# Altium footprint library 元件2.PcbLib: 204 footprints (part 13 of 13)
Each footprint in its own frame and in the unit in brackets; x right, y up, seen from the top. Pads: shape width x height; smd on the part's side, far side on the other; paste and mask are expansions set on the pad; w line width, h text height; cw(c..) or ccw(c..) is an arc to the next point about the centre after c.
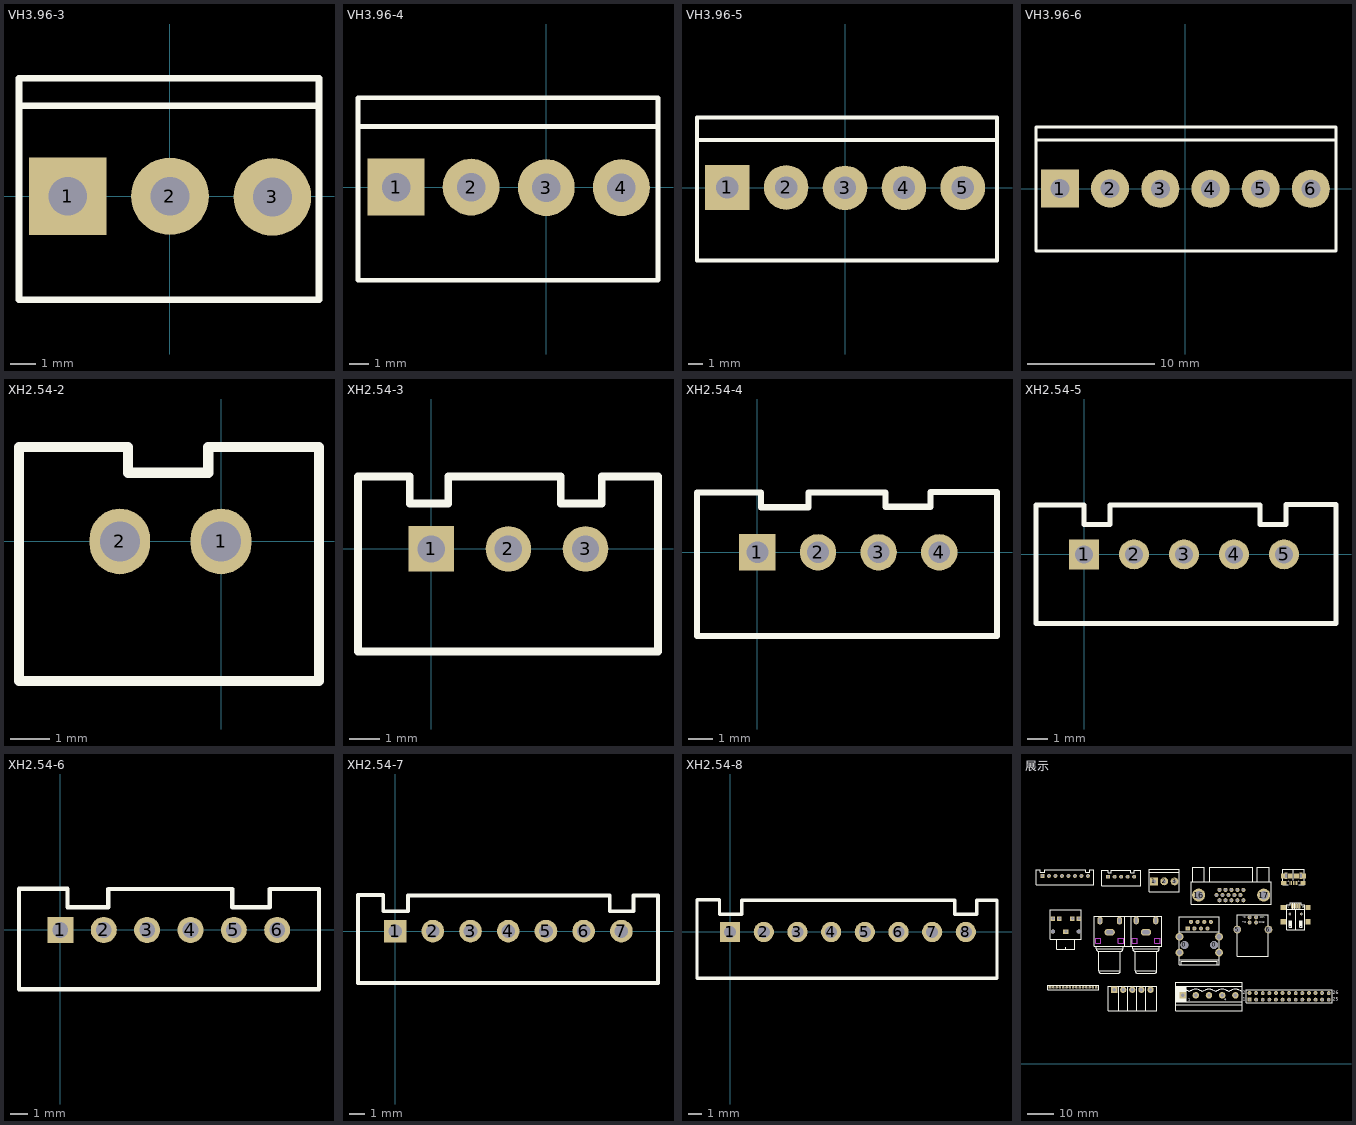
[diagram p12: the footprints below, top view; thin cyan lines are the x and y axes]

## VH3.96-3 [mm]
height 3.5
pads (3):
  rect 3x3 hole 1.5 square: 1(-3.96,0)
  round 3 hole 1.5 square: 2(0,0) 3(3.962,-0.025)
Top Overlay:
  lines w0.254: -5.842,3.505 5.74,3.505 ; -5.842,-4.013 5.766,-4.013 5.766,4.572 -5.842,4.572 -5.842,-4.013
3D body "VH3.stp": height 14.83, standoff -3.46, extent -5.842,-5.15 5.893,4.858

## VH3.96-4 [mm]
height 3.5
pads (4):
  rect 3x3 hole 1.5 square: 1(-7.921,0.013)
  round 3 hole 1.5 square: 2(-3.961,0.013) 3(0.001,-0.013) 4(3.961,-0.013)
Top Overlay:
  lines w0.254: -9.86,3.213 5.893,3.213 ; -9.931,-4.902 -9.931,4.724 5.893,4.724 5.893,-4.902 -9.931,-4.902
3D body "VH4.stp": height 14.83, standoff -3.46, extent -9.83,-5.055 5.867,4.953

## VH3.96-5 [mm]
height 3.5
pads (5):
  rect 3x3 hole 1.5 square: 1(-7.921,0.013)
  round 3 hole 1.5 square: 2(-3.961,0.013) 3(0.001,-0.013) 4(3.961,-0.013) 5(7.921,-0.013)
Top Overlay:
  lines w0.254: -9.86,3.213 10.147,3.213 ; -9.957,-4.902 -9.957,4.724 10.223,4.724 10.223,-4.902 -9.957,-4.902
3D body "VH5.stp": height 14.83, standoff -3.46, extent -9.728,-5.048 9.932,4.959

## VH3.96-6 [mm]
height 3.5
pads (6):
  rect 3x3 hole 1.5 square: 1(-9.901,0.013)
  round 3 hole 1.5 square: 2(-5.941,0.013) 3(-1.979,-0.013) 4(1.981,-0.013) 5(5.941,-0.013) 6(9.901,-0.013)
Top Overlay:
  lines w0.254: -11.789,3.848 11.839,3.848 ; -11.789,-4.928 -11.789,4.877 11.89,4.877 11.89,-4.928 -11.789,-4.928
3D body "VH6.stp": height 14.43, standoff -3.86, extent -11.709,-5.08 11.913,4.928

## XH2.54-2 [mil]
pads (2):
  oval 60x65 hole 39.37: 1(0,0) 2(-100.1,0)
Top Overlay:
  lines w10: -200,-138 97,-138 97,93.3 66.2,93.3 -12.6,93.3 -12.6,68 -92.1,68 -92.1,93.3 -200,93.3 -200,-138
3D body "sip2_n.stp": height 275.59, standoff -118.11, extent -197.64,-142.11 97.64,94.11

## XH2.54-3 [mm]
pads (3):
  rect 1.5x1.5 hole 0.9: 1(0,0)
  round 1.5 hole 0.9: 2(2.54,0) 3(5.08,0)
Top Overlay:
  lines w0.254: -2.413,-3.378 -2.413,2.388 -0.711,2.388 -0.711,1.5 0.559,1.5 0.559,2.388 4.267,2.388 4.267,1.5 5.613,1.5 5.613,2.388 7.468,2.388 7.468,-3.378 -2.413,-3.378
3D body "3pin-2.5.step": height 7, standoff -3.4, extent -2.41,-3.408 7.49,2.342

## XH2.54-4 [mm]
pads (4):
  rect 1.5x1.5 hole 0.9: 1(0,0)
  round 1.5 hole 0.9: 2(2.5,0) 3(5,0) 4(7.5,0)
Top Overlay:
  lines w0.254: -2.489,-3.454 -2.489,2.464 0.152,2.464 0.152,1.854 2.108,1.854 2.108,2.464 5.283,2.464 5.283,1.88 7.137,1.88 7.137,2.489 9.881,2.489 9.881,-3.454 -2.489,-3.454
3D body "4pin-2.5.step": height 7, standoff -3.4, extent -2.466,-3.383 9.934,2.367

## XH2.54-5 [mm]
pads (5):
  rect 1.5x1.5 hole 0.9: 1(0,0)
  round 1.5 hole 0.9: 2(2.5,0) 3(5,0) 4(7.5,0) 5(10,0)
Top Overlay:
  lines w0.254: 1.3,2.438 1.3,1.5 0,1.5 0,2.464 -2.4,2.464 -2.4,-3.454 12.6,-3.454 12.6,2.489 10.1,2.489 10.1,1.5 8.8,1.5 8.8,2.464 1.3,2.464
3D body "User Library-jst-b5b-xh-a.STEP": height 7, standoff -3.4, extent -2.511,-3.388 12.519,2.362

## XH2.54-6 [mm]
pads (6):
  rect 1.5x1.5 hole 0.9: 1(0,0)
  round 1.5 hole 0.9: 2(2.5,0) 3(5,0) 4(7.5,0) 5(10,0) 6(12.5,0)
Top Overlay:
  lines w0.254: -2.388,-3.429 -2.388,2.388 0.406,2.388 0.406,1.321 2.769,1.321 2.769,2.362 9.906,2.362 9.906,1.321 12.065,1.321 12.065,2.362 14.91,2.362 14.91,-3.429 -2.388,-3.429
3D body "6pin-2.5.step": height 7, standoff -3.4, extent -2.477,-3.383 14.923,2.367

## XH2.54-7 [mm]
pads (7):
  rect 1.5x1.5 hole 0.9: 1(0,0)
  round 1.5 hole 0.9: 2(2.5,0) 3(5,0) 4(7.5,0) 5(10,0) 6(12.5,0) 7(15,0)
Top Overlay:
  lines w0.254: -2.457,-3.429 -2.457,2.388 -0.787,2.388 -0.787,1.321 0.864,1.321 0.864,2.362 14.224,2.362 14.224,1.321 15.799,1.321 15.799,2.362 17.424,2.362 17.424,-3.429 -2.457,-3.429
3D body "XH7.step": height 7, standoff -3.4, extent -2.457,-3.388 17.443,2.362

## XH2.54-8 [mm]
pads (8):
  rect 1.5x1.5 hole 0.9: 1(0,0)
  round 1.5 hole 0.9: 2(2.5,0) 3(5,0) 4(7.5,0) 5(10,0) 6(12.5,0) 7(15,0) 8(17.5,0)
Top Overlay:
  lines w0.254: -2.457,-3.429 19.812,-3.429 19.812,2.362 18.313,2.362 18.313,1.321 16.662,1.321 16.662,2.362 0.864,2.362 0.864,1.321 -0.787,1.321 -0.787,2.388 -2.457,2.388 -2.457,-3.429
3D body "XH8.step": height 7, standoff -3.4, extent -2.462,-3.375 19.938,2.375

## 展示 [mm]
pads (141):
  rect 2.2x1.8 hole 1.2: 0(-300.478,50.778)
  round 3 hole 3: 0(-254.838,45.644) 0(-243.408,45.644)
  rect 2x2 smd: 0(-216.785,54.567) 0(-216.785,60.051)
  rect 1.9x1.9 smd: 0(-216.7,72.219) 0(-214.135,72.219) 0(-211.696,72.219) 0(-209.105,72.219)
  rect 2x1.5 smd: 0(-216.624,69.552) 0(-209.232,69.552)
  rect 1.2x2.5 hole 0.6 slot 1.5 at 90 deg: 0(-215.788,72.333) 0(-210.038,72.333)
  round 1 hole 0.8: 0(-214.239,57.567) 0(-209.839,57.567)
  rect 2x2.032 smd: 0(-207.293,54.567) 0(-207.293,60.067)
  rect 1.5x1.5 hole 0.9: 1(-309.499,72.238) 1(-284.226,71.907) 1(-229.794,24.613)
  rect 1x1 hole 0.6: 1(-306.553,29.337)
  rect 1.8x1.8 hole 1.2: 1(-305.478,55.778) 2(-295.478,55.778) 3(-302.978,55.778) 4(-297.978,55.778)
  rect 2.4x2.4 hole 1.3: 1(-281.889,28.423)
  oval 2x3 hole 0.8 slot 2 at 90 deg: 1(-273.361,55.067) 1(-265.868,55.067) 3(-287.344,55.016) 3(-279.825,55.016)
  rect 3x3 hole 1.5 square: 1(-266.571,70.129)
  rect 2.5x2.5 hole 1.3: 1(-255.549,26.289)
  rect 1.575x1.575 hole 0.762: 1(-253.568,51.994)
  round 1.58 hole 1: 1(-241.354,62.865) 2(-239.054,62.865) 3(-236.754,62.865) 4(-234.454,62.865) 5(-232.154,62.865) 6(-242.504,64.857) 7(-240.204,64.857) 8(-237.904,64.857) 9(-235.604,64.857) 10(-233.304,64.857) 11(-241.354,66.849) 12(-239.054,66.849) 13(-236.754,66.849) 14(-234.454,66.849) 15(-232.154,66.849)
  round 1.524 hole 0.92: 1(-227.262,56.292) 2(-229.762,56.292) 3(-229.762,54.292) 4(-227.262,54.292)
  rect 0.52x2 smd: 1(-213.665,60.604) 2(-212.852,60.604) 3(-212.039,60.604) 4(-211.226,60.604) 5(-210.414,60.604)
  rect 0.4x1.6 smd: 1(-211.62,69.501) 2(-212.268,69.501) 3(-212.915,69.501) 4(-213.563,69.501) 5(-214.211,69.501)
  round 1.5 hole 0.9: 2(-306.999,72.238) 2(-281.726,71.907) 2(-229.794,27.153) 3(-304.499,72.238) 3(-279.226,71.907) 3(-227.254,24.613) 4(-301.999,72.238) 4(-276.726,71.907) 4(-227.254,27.153) 5(-299.499,72.238) 5(-274.226,71.907) 5(-224.714,24.613) 6(-296.999,72.238) 6(-224.714,27.153) 7(-294.499,72.238) 7(-222.174,24.613) 8(-291.999,72.238) 8(-222.174,27.153) 9(-219.634,24.613) 10(-219.634,27.153) 11(-217.094,24.613) 12(-217.094,27.153) 13(-214.554,24.613) 14(-214.554,27.153) 15(-212.014,24.613) 16(-212.014,27.153) 17(-209.474,24.613) 18(-209.474,27.153) 19(-206.934,24.613) 20(-206.934,27.153) 21(-204.394,24.613) 22(-204.394,27.153) 23(-201.854,24.613) 24(-201.854,27.153) 25(-199.314,24.613) 26(-199.314,27.153)
  round 1 hole 0.6: 2(-305.283,29.337) 3(-304.013,29.337) 4(-302.743,29.337) 5(-301.473,29.337) 6(-300.203,29.337) 7(-298.933,29.337) 8(-297.663,29.337) 9(-296.393,29.337) 10(-295.123,29.337) 11(-293.853,29.337) 12(-292.583,29.337) 13(-291.313,29.337) 14(-290.043,29.337) 15(-288.773,29.337)
  round 2.4 hole 1.3: 2(-278.389,28.423) 3(-274.889,28.423) 4(-271.389,28.423) 5(-267.889,28.423)
  oval 4x2.5 hole 1.5 slot 2.8 at 0 deg: 2(-269.627,50.546) 4(-283.623,50.546)
  round 3 hole 1.5 square: 2(-262.611,70.129) 3(-258.648,70.104)
  round 1.575 hole 0.762: 2(-252.298,54.534) 3(-251.028,51.994) 4(-249.758,54.534) 5(-248.488,51.994) 6(-247.218,54.534) 7(-245.948,51.994) 8(-244.678,54.534)
  round 2.5 hole 1.3: 2(-250.469,26.289) 3(-245.389,26.289) 4(-240.309,26.289) 5(-235.229,26.289)
  round 1.6 hole 1.6 unplated: 5(-295.478,50.778) 6(-305.478,50.778)
  round 3 hole 2.4: 5(-234.512,51.592) 6(-222.512,51.592)
  round 5 hole 3.25: 16(-249.354,64.857) 17(-224.354,64.857)
  round 3 hole 2: G01(-241.503,48.819) G02(-256.743,48.819) G03(-241.503,42.723) G04(-256.743,42.723)
via -210.909,70.183 diameter 0.6 hole 0.6
via -214.909,70.183 diameter 0.6 hole 0.6
Top Overlay:
  drawing of 173 lines, arcs and shapes, not listed
  text "26" at -197.79,26.645 h1.27
  text "25" at -197.79,24.105 h1.27
  text "1" at -232.334,24.105 h1.27
  text "2" at -232.334,26.645 h1.27
  text "GND" at -223.952,54.686 h0.76
  text "VCC" at -223.952,56.718 h0.76
  text "D+" at -231.14,54.762 h0.76
  text "D-" at -231.165,56.693 h0.76
  text "G" at -209.525,59.868 h0.76
  text "V" at -215.087,59.868 h0.76
  text "1" at -253.441,24.181 h1.02
  text "4" at -239.497,24.257 h1.02
Keep-Out Layer:
  lines w0.2: -289.027,46.253 -286.995,46.253 -286.995,48.285 -289.027,48.285 -289.027,46.253 ; -280.238,46.253 -280.238,48.26 -278.206,48.26 -278.206,46.253 -280.238,46.253 ; -275.006,46.279 -275.006,48.26 -272.999,48.26 -272.999,46.279 -275.006,46.279 ; -266.243,46.279 -264.211,46.279 -264.211,48.285 -266.243,48.285 -266.243,46.279
Mechanical 1:
  lines w0.2: -289.027,46.253 -289.027,48.285 -286.995,48.285 -286.995,46.253 -289.027,46.253 ; -280.238,46.253 -278.206,46.253 -278.206,48.26 -280.238,48.26 -280.238,46.253 ; -275.006,46.279 -272.999,46.279 -272.999,48.26 -275.006,48.26 -275.006,46.279 ; -266.243,46.279 -266.243,48.285 -264.211,48.285 -264.211,46.279 -266.243,46.279
Mechanical 2:
  lines w0.254: -287.859,54.045 -286.859,54.045 -286.859,56.045 -287.859,56.045 -287.859,54.045 ; -284.876,49.958 -282.376,49.958 -282.376,51.158 -284.876,51.158 -284.876,49.958 ; -280.359,54.045 -279.359,54.045 -279.359,56.045 -280.359,56.045 -280.359,54.045 ; -273.881,54.096 -272.881,54.096 -272.881,56.096 -273.881,56.096 -273.881,54.096 ; -270.876,49.958 -268.376,49.958 -268.376,51.158 -270.876,51.158 -270.876,49.958 ; -266.381,54.096 -265.381,54.096 -265.381,56.096 -266.381,56.096 -266.381,54.096
3D body "HDR2x13.STEP": height 8.54, standoff -3, extent -231.064,23.343 -198.044,28.423
3D body "CTB93HD_3.step": height 7.25, standoff -3.4, extent -277.374,20.47 -265.474,29.67
3D body "CTB93HD_2.step": height 7.25, standoff -3.4, extent -284.328,20.47 -275.928,29.67
3D body "av2-8-4-13.STEP": height 2.5, standoff -17, extent -289.618,34.685 -263.62,59.385
3D body "USB-B.step": height 11.4, standoff -3.58, extent -235.689,41.252 -221.207,57.452
3D body "MICRO USB.STEP": height 2.77, standoff -0.17, extent -217.003,68.867 -208.803,74.797
3D body "VH3.stp": height 14.83, standoff -3.46, extent -268.452,64.98 -256.718,74.987
3D body "XH8.step": height 7, standoff -3.4, extent -311.961,68.863 -289.561,74.613
3D body "User Library-jst-b5b-xh-a.STEP": height 7, standoff -3.4, extent -286.737,68.52 -271.707,74.27
3D body "User Library-SLIM D-SUB RIGHT ANGLE PCB MOUNT.step": height 10.25, standoff -3.09, extent -252.156,61.79 -221.356,75.26
3D body "miniUSB-DIP.STEP": height 3.95, standoff -1, extent -217.354,51.813 -206.654,61.013
3D body "RJ45-8P-Pipe-Cat6.step": height 14.55, standoff -3.6, extent -257.884,35.447 -240.284,59.447
3D body "耳机.ST": height 3.2, standoff -10.8, extent -306.537,44.368 -294.437,59.468
3D body "mhdr15.STEP": height 10.15, standoff 0, extent -307.823,28.067 -287.503,30.607
3D body "050-5.step": height 11, standoff -2, extent -258.049,20.789 -233.049,28.789